# Altium footprint library Connektor.PcbLib: 305 footprints (part 9 of 20)
Each footprint in its own frame and in the unit in brackets; x right, y up, seen from the top. Pads: shape width x height; smd on the part's side, far side on the other; paste and mask are expansions set on the pad; w line width, h text height; cw(c..) or ccw(c..) is an arc to the next point about the centre after c.
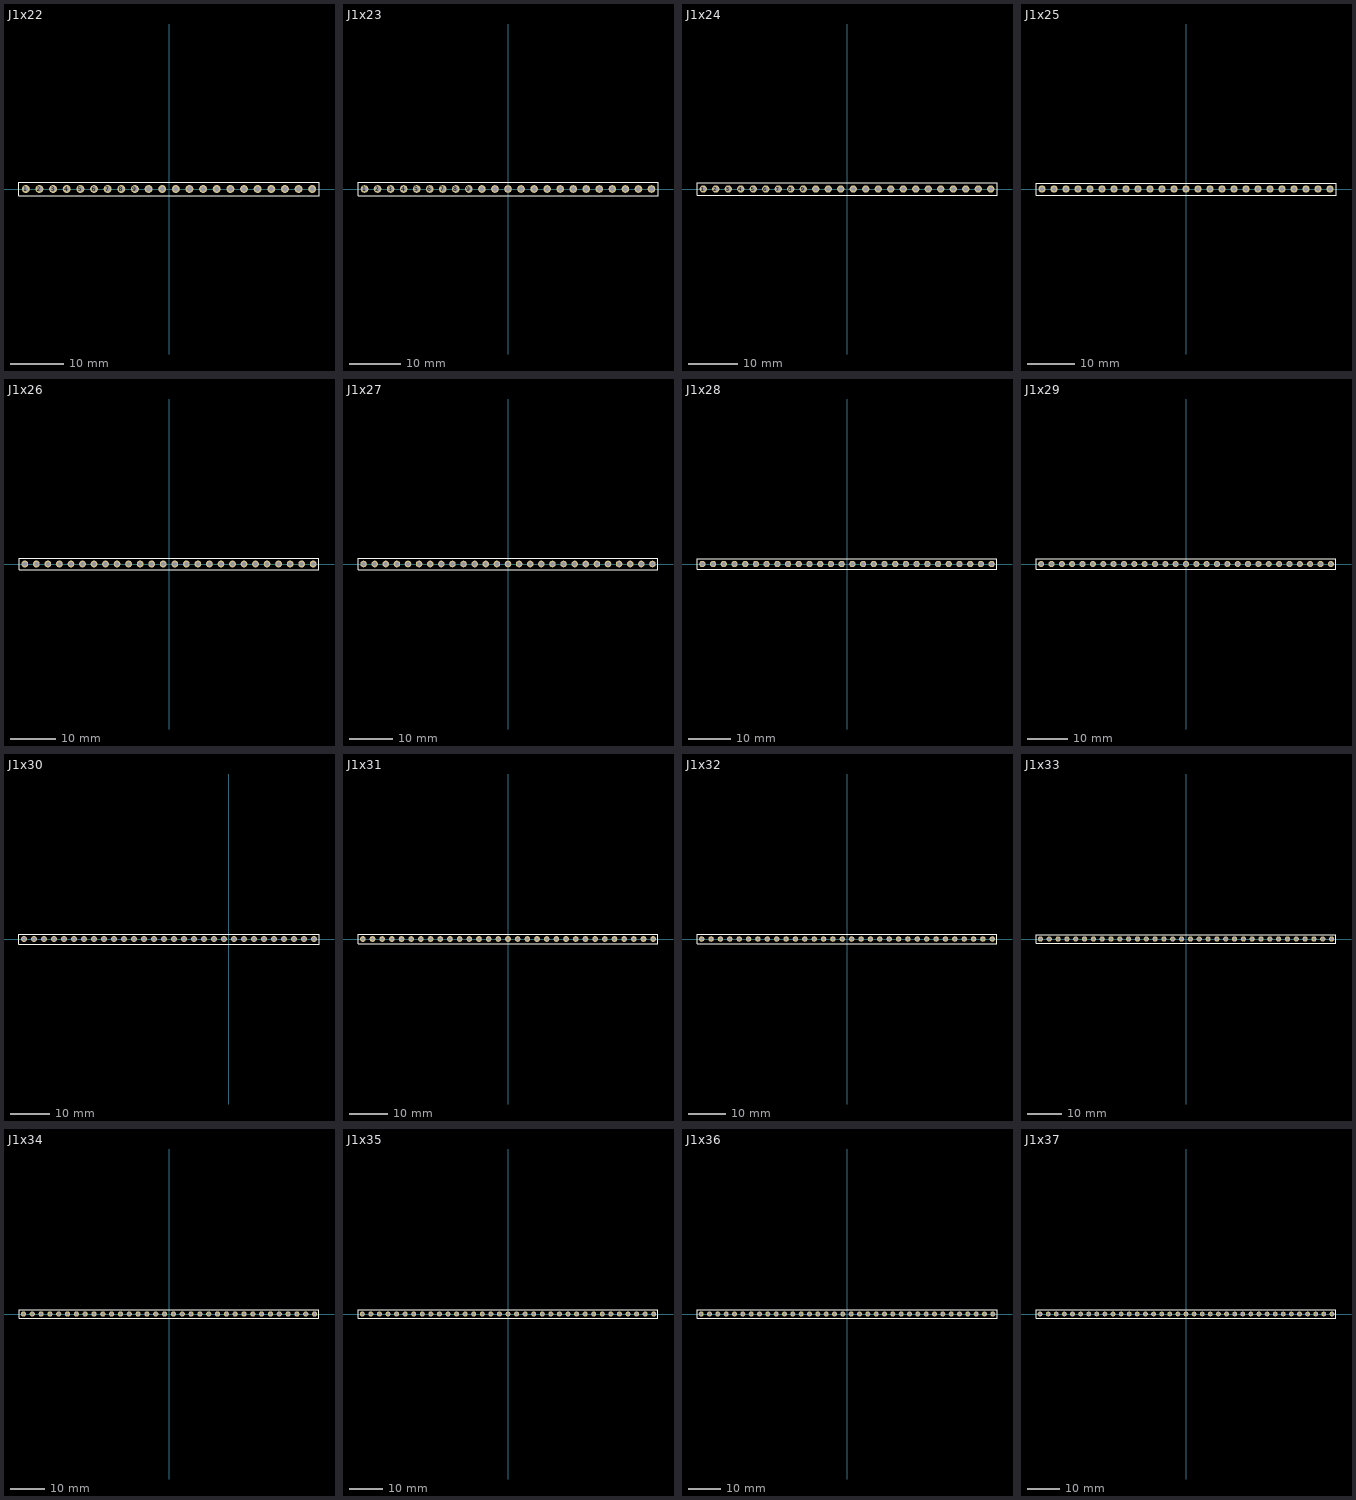
[diagram p8: the footprints below, top view; thin cyan lines are the x and y axes]

## J1x22 [mm]
pads (22):
  round 1.5 hole 0.9: 1(-26.67,0) 2(-24.13,0) 3(-21.59,0) 4(-19.05,0) 5(-16.51,0) 6(-13.97,0) 7(-11.43,0) 8(-8.89,0) 9(-6.35,0) 10(-3.81,0) 11(-1.27,0) 12(1.27,0) 13(3.81,0) 14(6.35,0) 15(8.89,0) 16(11.43,0) 17(13.97,0) 18(16.51,0) 19(19.05,0) 20(21.59,0) 21(24.13,0) 22(26.67,0)
TopOverlay:
  lines w0.127: -27.94,-1.27 -27.94,1.27 27.94,1.27 27.94,-1.27 -27.94,-1.27
3D body: height 10.1, standoff -1.5, extent -27.94,-1.27 27.94,1.27

## J1x23 [mm]
pads (23):
  round 1.5 hole 0.9: 1(-27.94,0) 2(-25.4,0) 3(-22.86,0) 4(-20.32,0) 5(-17.78,0) 6(-15.24,0) 7(-12.7,0) 8(-10.16,0) 9(-7.62,0) 10(-5.08,0) 11(-2.54,0) 12(0,0) 13(2.54,0) 14(5.08,0) 15(7.62,0) 16(10.16,0) 17(12.7,0) 18(15.24,0) 19(17.78,0) 20(20.32,0) 21(22.86,0) 22(25.4,0) 23(27.94,0)
TopOverlay:
  lines w0.127: -29.21,-1.27 -29.21,1.27 29.21,1.27 29.21,-1.27 -29.21,-1.27
3D body: height 10.1, standoff -1.5, extent -29.21,-1.27 29.21,1.27

## J1x24 [mm]
pads (24):
  round 1.5 hole 0.9: 1(-29.21,0) 2(-26.67,0) 3(-24.13,0) 4(-21.59,0) 5(-19.05,0) 6(-16.51,0) 7(-13.97,0) 8(-11.43,0) 9(-8.89,0) 10(-6.35,0) 11(-3.81,0) 12(-1.27,0) 13(1.27,0) 14(3.81,0) 15(6.35,0) 16(8.89,0) 17(11.43,0) 18(13.97,0) 19(16.51,0) 20(19.05,0) 21(21.59,0) 22(24.13,0) 23(26.67,0) 24(29.21,0)
TopOverlay:
  lines w0.127: -30.48,-1.27 30.48,-1.27 30.48,1.27 -30.48,1.27 -30.48,-1.27
3D body: height 10.1, standoff -1.5, extent -30.48,-1.27 30.48,1.27

## J1x25 [mm]
pads (25):
  round 1.5 hole 0.9: 1(-30.48,0) 2(-27.94,0) 3(-25.4,0) 4(-22.86,0) 5(-20.32,0) 6(-17.78,0) 7(-15.24,0) 8(-12.7,0) 9(-10.16,0) 10(-7.62,0) 11(-5.08,0) 12(-2.54,0) 13(0,0) 14(2.54,0) 15(5.08,0) 16(7.62,0) 17(10.16,0) 18(12.7,0) 19(15.24,0) 20(17.78,0) 21(20.32,0) 22(22.86,0) 23(25.4,0) 24(27.94,0) 25(30.48,0)
TopOverlay:
  lines w0.127: -31.75,-1.27 31.75,-1.27 31.75,1.27 -31.75,1.27 -31.75,-1.27
3D body: height 10.1, standoff -1.5, extent -31.75,-1.27 31.75,1.27

## J1x26 [mm]
pads (26):
  round 1.5 hole 0.9: 1(-31.75,0) 2(-29.21,0) 3(-26.67,0) 4(-24.13,0) 5(-21.59,0) 6(-19.05,0) 7(-16.51,0) 8(-13.97,0) 9(-11.43,0) 10(-8.89,0) 11(-6.35,0) 12(-3.81,0) 13(-1.27,0) 14(1.27,0) 15(3.81,0) 16(6.35,0) 17(8.89,0) 18(11.43,0) 19(13.97,0) 20(16.51,0) 21(19.05,0) 22(21.59,0) 23(24.13,0) 24(26.67,0) 25(29.21,0) 26(31.75,0)
TopOverlay:
  lines w0.127: -33.02,-1.27 33.02,-1.27 33.02,1.27 -33.02,1.27 -33.02,-1.27
3D body: height 10.1, standoff -1.5, extent -33.02,-1.27 33.02,1.27

## J1x27 [mm]
pads (27):
  round 1.5 hole 0.9: 1(-33.02,0) 2(-30.48,0) 3(-27.94,0) 4(-25.4,0) 5(-22.86,0) 6(-20.32,0) 7(-17.78,0) 8(-15.24,0) 9(-12.7,0) 10(-10.16,0) 11(-7.62,0) 12(-5.08,0) 13(-2.54,0) 14(0,0) 15(2.54,0) 16(5.08,0) 17(7.62,0) 18(10.16,0) 19(12.7,0) 20(15.24,0) 21(17.78,0) 22(20.32,0) 23(22.86,0) 24(25.4,0) 25(27.94,0) 26(30.48,0) 27(33.02,0)
TopOverlay:
  lines w0.127: -34.29,-1.27 34.29,-1.27 34.29,1.27 -34.29,1.27 -34.29,-1.27
3D body: height 10.1, standoff -1.5, extent -34.29,-1.27 34.29,1.27

## J1x28 [mm]
pads (28):
  round 1.5 hole 0.9: 1(-34.29,0) 2(-31.75,0) 3(-29.21,0) 4(-26.67,0) 5(-24.13,0) 6(-21.59,0) 7(-19.05,0) 8(-16.51,0) 9(-13.97,0) 10(-11.43,0) 11(-8.89,0) 12(-6.35,0) 13(-3.81,0) 14(-1.27,0) 15(1.27,0) 16(3.81,0) 17(6.35,0) 18(8.89,0) 19(11.43,0) 20(13.97,0) 21(16.51,0) 22(19.05,0) 23(21.59,0) 24(24.13,0) 25(26.67,0) 26(29.21,0) 27(31.75,0) 28(34.29,0)
TopOverlay:
  lines w0.127: -35.56,-1.27 -35.56,1.27 35.56,1.27 35.56,-1.27 -35.56,-1.27
3D body: height 10.1, standoff -1.5, extent -35.56,-1.27 35.56,1.27

## J1x29 [mm]
pads (29):
  round 1.5 hole 0.9: 1(-35.56,0) 2(-33.02,0) 3(-30.48,0) 4(-27.94,0) 5(-25.4,0) 6(-22.86,0) 7(-20.32,0) 8(-17.78,0) 9(-15.24,0) 10(-12.7,0) 11(-10.16,0) 12(-7.62,0) 13(-5.08,0) 14(-2.54,0) 15(0,0) 16(2.54,0) 17(5.08,0) 18(7.62,0) 19(10.16,0) 20(12.7,0) 21(15.24,0) 22(17.78,0) 23(20.32,0) 24(22.86,0) 25(25.4,0) 26(27.94,0) 27(30.48,0) 28(33.02,0) 29(35.56,0)
TopOverlay:
  lines w0.127: -36.83,-1.27 -36.83,1.27 36.83,1.27 36.83,-1.27 -36.83,-1.27
3D body: height 10.1, standoff -1.5, extent -36.83,-1.27 36.83,1.27

## J1x30 [mm]
pads (30):
  round 1.5 hole 0.9: 1(-52.07,0) 2(-49.53,0) 3(-46.99,0) 4(-44.45,0) 5(-41.91,0) 6(-39.37,0) 7(-36.83,0) 8(-34.29,0) 9(-31.75,0) 10(-29.21,0) 11(-26.67,0) 12(-24.13,0) 13(-21.59,0) 14(-19.05,0) 15(-16.51,0) 16(-13.97,0) 17(-11.43,0) 18(-8.89,0) 19(-6.35,0) 20(-3.81,0) 21(-1.27,0) 22(1.27,0) 23(3.81,0) 24(6.35,0) 25(8.89,0) 26(11.43,0) 27(13.97,0) 28(16.51,0) 29(19.05,0) 30(21.59,0)
TopOverlay:
  lines w0.127: -53.34,-1.27 -53.34,1.27 22.86,1.27 22.86,-1.27 -53.34,-1.27
3D body: height 10.1, standoff -1.5, extent -53.34,-1.27 22.86,1.27

## J1x31 [mm]
pads (31):
  round 1.5 hole 0.9: 1(-38.1,0) 2(-35.56,0) 3(-33.02,0) 4(-30.48,0) 5(-27.94,0) 6(-25.4,0) 7(-22.86,0) 8(-20.32,0) 9(-17.78,0) 10(-15.24,0) 11(-12.7,0) 12(-10.16,0) 13(-7.62,0) 14(-5.08,0) 15(-2.54,0) 16(0,0) 17(2.54,0) 18(5.08,0) 19(7.62,0) 20(10.16,0) 21(12.7,0) 22(15.24,0) 23(17.78,0) 24(20.32,0) 25(22.86,0) 26(25.4,0) 27(27.94,0) 28(30.48,0) 29(33.02,0) 30(35.56,0) 31(38.1,0)
TopOverlay:
  lines w0.127: -39.37,-1.27 -39.37,1.27 39.37,1.27 39.37,-1.27 -39.37,-1.27
3D body: height 10.1, standoff -1.5, extent -39.37,-1.27 39.37,1.27

## J1x32 [mm]
pads (32):
  round 1.5 hole 0.9: 1(-39.37,0) 2(-36.83,0) 3(-34.29,0) 4(-31.75,0) 5(-29.21,0) 6(-26.67,0) 7(-24.13,0) 8(-21.59,0) 9(-19.05,0) 10(-16.51,0) 11(-13.97,0) 12(-11.43,0) 13(-8.89,0) 14(-6.35,0) 15(-3.81,0) 16(-1.27,0) 17(1.27,0) 18(3.81,0) 19(6.35,0) 20(8.89,0) 21(11.43,0) 22(13.97,0) 23(16.51,0) 24(19.05,0) 25(21.59,0) 26(24.13,0) 27(26.67,0) 28(29.21,0) 29(31.75,0) 30(34.29,0) 31(36.83,0) 32(39.37,0)
TopOverlay:
  lines w0.127: -40.64,-1.27 40.64,-1.27 40.64,1.27 -40.64,1.27 -40.64,-1.27
3D body: height 10.1, standoff -1.5, extent -40.64,-1.27 40.64,1.27

## J1x33 [mm]
pads (34):
  round 1.5 hole 0.9: 1(-41.91,0) 2(-39.37,0) 3(-36.83,0) 4(-34.29,0) 5(-31.75,0) 6(-29.21,0) 7(-26.67,0) 8(-24.13,0) 9(-21.59,0) 10(-19.05,0) 11(-16.51,0) 12(-13.97,0) 13(-11.43,0) 14(-8.89,0) 15(-6.35,0) 16(-3.81,0) 17(-1.27,0) 18(1.27,0) 19(3.81,0) 20(6.35,0) 21(8.89,0) 22(11.43,0) 23(13.97,0) 24(16.51,0) 25(19.05,0) 26(21.59,0) 27(24.13,0) 28(26.67,0) 29(29.21,0) 30(31.75,0) 31(34.29,0) 32(36.83,0) 33(39.37,0) 34(41.91,0)
TopOverlay:
  lines w0.127: -43.18,-1.27 -43.18,1.27 43.18,1.27 43.18,-1.27 -43.18,-1.27
3D body: height 10.1, standoff -1.5, extent -43.18,-1.27 40.64,1.27

## J1x34 [mm]
pads (34):
  round 1.5 hole 0.9: 1(-41.91,0) 2(-39.37,0) 3(-36.83,0) 4(-34.29,0) 5(-31.75,0) 6(-29.21,0) 7(-26.67,0) 8(-24.13,0) 9(-21.59,0) 10(-19.05,0) 11(-16.51,0) 12(-13.97,0) 13(-11.43,0) 14(-8.89,0) 15(-6.35,0) 16(-3.81,0) 17(-1.27,0) 18(1.27,0) 19(3.81,0) 20(6.35,0) 21(8.89,0) 22(11.43,0) 23(13.97,0) 24(16.51,0) 25(19.05,0) 26(21.59,0) 27(24.13,0) 28(26.67,0) 29(29.21,0) 30(31.75,0) 31(34.29,0) 32(36.83,0) 33(39.37,0) 34(41.91,0)
TopOverlay:
  lines w0.127: -43.18,-1.27 43.18,-1.27 43.18,1.27 -43.18,1.27 -43.18,-1.27
3D body: height 10.1, standoff -1.5, extent -43.18,-1.27 43.18,1.27

## J1x35 [mm]
pads (35):
  round 1.5 hole 0.9: 1(-43.18,0) 2(-40.64,0) 3(-38.1,0) 4(-35.56,0) 5(-33.02,0) 6(-30.48,0) 7(-27.94,0) 8(-25.4,0) 9(-22.86,0) 10(-20.32,0) 11(-17.78,0) 12(-15.24,0) 13(-12.7,0) 14(-10.16,0) 15(-7.62,0) 16(-5.08,0) 17(-2.54,0) 18(0,0) 19(2.54,0) 20(5.08,0) 21(7.62,0) 22(10.16,0) 23(12.7,0) 24(15.24,0) 25(17.78,0) 26(20.32,0) 27(22.86,0) 28(25.4,0) 29(27.94,0) 30(30.48,0) 31(33.02,0) 32(35.56,0) 33(38.1,0) 34(40.64,0) 35(43.18,0)
TopOverlay:
  lines w0.127: -44.45,-1.27 44.45,-1.27 44.45,1.27 -44.45,1.27 -44.45,-1.27
3D body: height 10.1, standoff -1.5, extent -44.45,-1.27 44.45,1.27

## J1x36 [mm]
pads (36):
  round 1.5 hole 0.9: 1(-44.45,0) 2(-41.91,0) 3(-39.37,0) 4(-36.83,0) 5(-34.29,0) 6(-31.75,0) 7(-29.21,0) 8(-26.67,0) 9(-24.13,0) 10(-21.59,0) 11(-19.05,0) 12(-16.51,0) 13(-13.97,0) 14(-11.43,0) 15(-8.89,0) 16(-6.35,0) 17(-3.81,0) 18(-1.27,0) 19(1.27,0) 20(3.81,0) 21(6.35,0) 22(8.89,0) 23(11.43,0) 24(13.97,0) 25(16.51,0) 26(19.05,0) 27(21.59,0) 28(24.13,0) 29(26.67,0) 30(29.21,0) 31(31.75,0) 32(34.29,0) 33(36.83,0) 34(39.37,0) 35(41.91,0) 36(44.45,0)
TopOverlay:
  lines w0.127: -45.72,-1.27 -45.72,1.27 45.72,1.27 45.72,-1.27 -45.72,-1.27
3D body: height 10.1, standoff -1.5, extent -45.72,-1.27 45.72,1.27

## J1x37 [mm]
pads (37):
  round 1.5 hole 0.9: 1(-45.72,0) 2(-43.18,0) 3(-40.64,0) 4(-38.1,0) 5(-35.56,0) 6(-33.02,0) 7(-30.48,0) 8(-27.94,0) 9(-25.4,0) 10(-22.86,0) 11(-20.32,0) 12(-17.78,0) 13(-15.24,0) 14(-12.7,0) 15(-10.16,0) 16(-7.62,0) 17(-5.08,0) 18(-2.54,0) 19(0,0) 20(2.54,0) 21(5.08,0) 22(7.62,0) 23(10.16,0) 24(12.7,0) 25(15.24,0) 26(17.78,0) 27(20.32,0) 28(22.86,0) 29(25.4,0) 30(27.94,0) 31(30.48,0) 32(33.02,0) 33(35.56,0) 34(38.1,0) 35(40.64,0) 36(43.18,0) 37(45.72,0)
TopOverlay:
  lines w0.127: -46.99,-1.27 -46.99,1.27 46.99,1.27 46.99,-1.27 -46.99,-1.27
3D body: height 10.1, standoff -1.5, extent -46.99,-1.27 46.99,1.27